# Altium schematic symbol library My Library.SchLib: 1211 symbols (part 9 of 12) (continued)
## Motor Step
designator B?
Motor Stepper; Published: 24-Mar-1999; LatestRevisionDate: 17-Jul-2002; LatestRevisionNote: Re-released for DXP Platform.; PackageReference: DIP-6; Publisher: Altium Limited; Code_JEDEC: MO-001-AM
footprint HDR1X6 - L (Connector; Header; 6 Position)
footprint HDR1X6 - L (Connector; Header; 6 Position)
pins: 1 1A, 2, 3, 4, 5, 6
text: M

## MPS20N0040D-D
designator IC?
Pressure Sensor
footprint SOP-6
pins: 1 OUT- (out), 2 IN- (in), 3 NC, 4 OUT+ (out), 5 IN+ (in), 6 OUT- (out)

## MPU6050
designator MU?
Manufacturer: W¨¹rth Elektronik eiSos GmbH; partNo: 613004143121; ComponentLink1 Description: Manufacturer; ComponentLink2 Description: Datasheet; NoPins: 04; Created Date: 29 March 2013; ComponentLink1URL: http://www.we-online.com; ComponentLink2URL: http://katalog.we-online.de/em/datasheet/6130xx143121.pdf; Created by: Karrer Zheng
footprint MPU6050
pins: 1 VCC, 2 GND, 3 SCL, 4 SDA, 5 XDA, 6 XCL, 7 AD0, 8 INT

## MPX5050GP
designator S?
50kPa Air Pressure Sensor
footprint HDR1X6 (Connector; Header; 6 Position)
pins: 1 VOUT, 2 GND, 3 VCC, 4 NC, 5 NC, 6 NC

## MQ2
designator J?, comment Gas Sensor Socket
footprint MQ2 (6P-D17.6X9.8H)
pins: 1 A, 2 H, 3 A, 4 B, 5 H, 6 B

## MQ2-MOD
designator C?
Manufacturer: W¨¹rth Elektronik eiSos GmbH; partNo: 613004143121; ComponentLink1 Description: Manufacturer; ComponentLink2 Description: Datasheet; NoPins: 04; Created Date: 29 March 2013; ComponentLink1URL: http://www.we-online.com; ComponentLink2URL: http://katalog.we-online.de/em/datasheet/6130xx143121.pdf; Created by: Karrer Zheng
footprint MQ2-MODULE
footprint JP4-C1T (4 row, straight, gold plating)
pins: 1 Aout, 2 Dout, 3 GND, 4 VCC
text: MQ2

## MQ5-MOD
designator C?
Manufacturer: W¨¹rth Elektronik eiSos GmbH; partNo: 613004143121; ComponentLink1 Description: Manufacturer; ComponentLink2 Description: Datasheet; NoPins: 04; Created Date: 29 March 2013; ComponentLink1URL: http://www.we-online.com; ComponentLink2URL: http://katalog.we-online.de/em/datasheet/6130xx143121.pdf; Created by: Karrer Zheng
footprint MQ5-MODULE
footprint JP4-C1T (4 row, straight, gold plating)
pins: 1 Dout, 2 Aout, 3 GND, 4 VCC
text: MQ5

## MQ6-MOD
designator C?
Manufacturer: W¨¹rth Elektronik eiSos GmbH; partNo: 613004143121; ComponentLink1 Description: Manufacturer; ComponentLink2 Description: Datasheet; NoPins: 04; Created Date: 29 March 2013; ComponentLink1URL: http://www.we-online.com; ComponentLink2URL: http://katalog.we-online.de/em/datasheet/6130xx143121.pdf; Created by: Karrer Zheng
footprint MQ6-MODULE
footprint JP4-C1T (4 row, straight, gold plating)
pins: 1 Aout, 2 Dout, 3 GND, 4 VCC
text: MQ6

## MQ7-MOD
designator C?
Manufacturer: W¨¹rth Elektronik eiSos GmbH; partNo: 613004143121; ComponentLink1 Description: Manufacturer; ComponentLink2 Description: Datasheet; NoPins: 04; Created Date: 29 March 2013; ComponentLink1URL: http://www.we-online.com; ComponentLink2URL: http://katalog.we-online.de/em/datasheet/6130xx143121.pdf; Created by: Karrer Zheng
footprint MQ6-MODULE
footprint JP4-C1T (4 row, straight, gold plating)
pins: 1 Dout, 2 Aout, 3 GND, 4 VCC
text: MQ7

## MQ-2
designator IC?
MQ-2 GAS SENSOR
footprint MQ-2 (MQ-2 GAS SENSOR)
pins: 1 A, 2 H, 3 A, 4 B, 5 H, 6 B

## MRF24J40MA
designator M?
Microchip Zigbee Module
footprint MRF24J40MA (Microchip Zigbee Module)
pins: 1 GND, 2 ~{RESET}, 3 WAKE, 4 INT, 5 SDI, 6 SDK, 7 SDO, 8 ~{CS}, 9 CLKOUT, 10 VIN, 11 GND, 12 GND

## MRF24J40MA_1
designator M?, comment MRF24J40MA
Microchip Zigbee Module
footprint MRF24J40MA (Microchip Zigbee Module)
pins: 1 GND, 2 ~{RESET}, 3 WAKE, 4 INT, 5 SDI, 6 SDK, 7 SDO, 8 ~{CS}, 9 CLKOUT, 10 VIN, 11 GND, 12 GND

## MSP430_launchpad
designator KIT?
footprint MSP430_launchpad
pins: 1 3V3, 2 P1.0, 3 P1.1/RXD, 4 P1.2/TXD, 5 1.3, 6 1.4, 7 1.5, 8 2.0, 9 2.1, 10 2.2, 11 2.3, 12 2.4, 13 2.5, 14 1.6, 15 1.7, 16 RST, 17 TEST, 18 2.6, 19 2.7, 20 GND

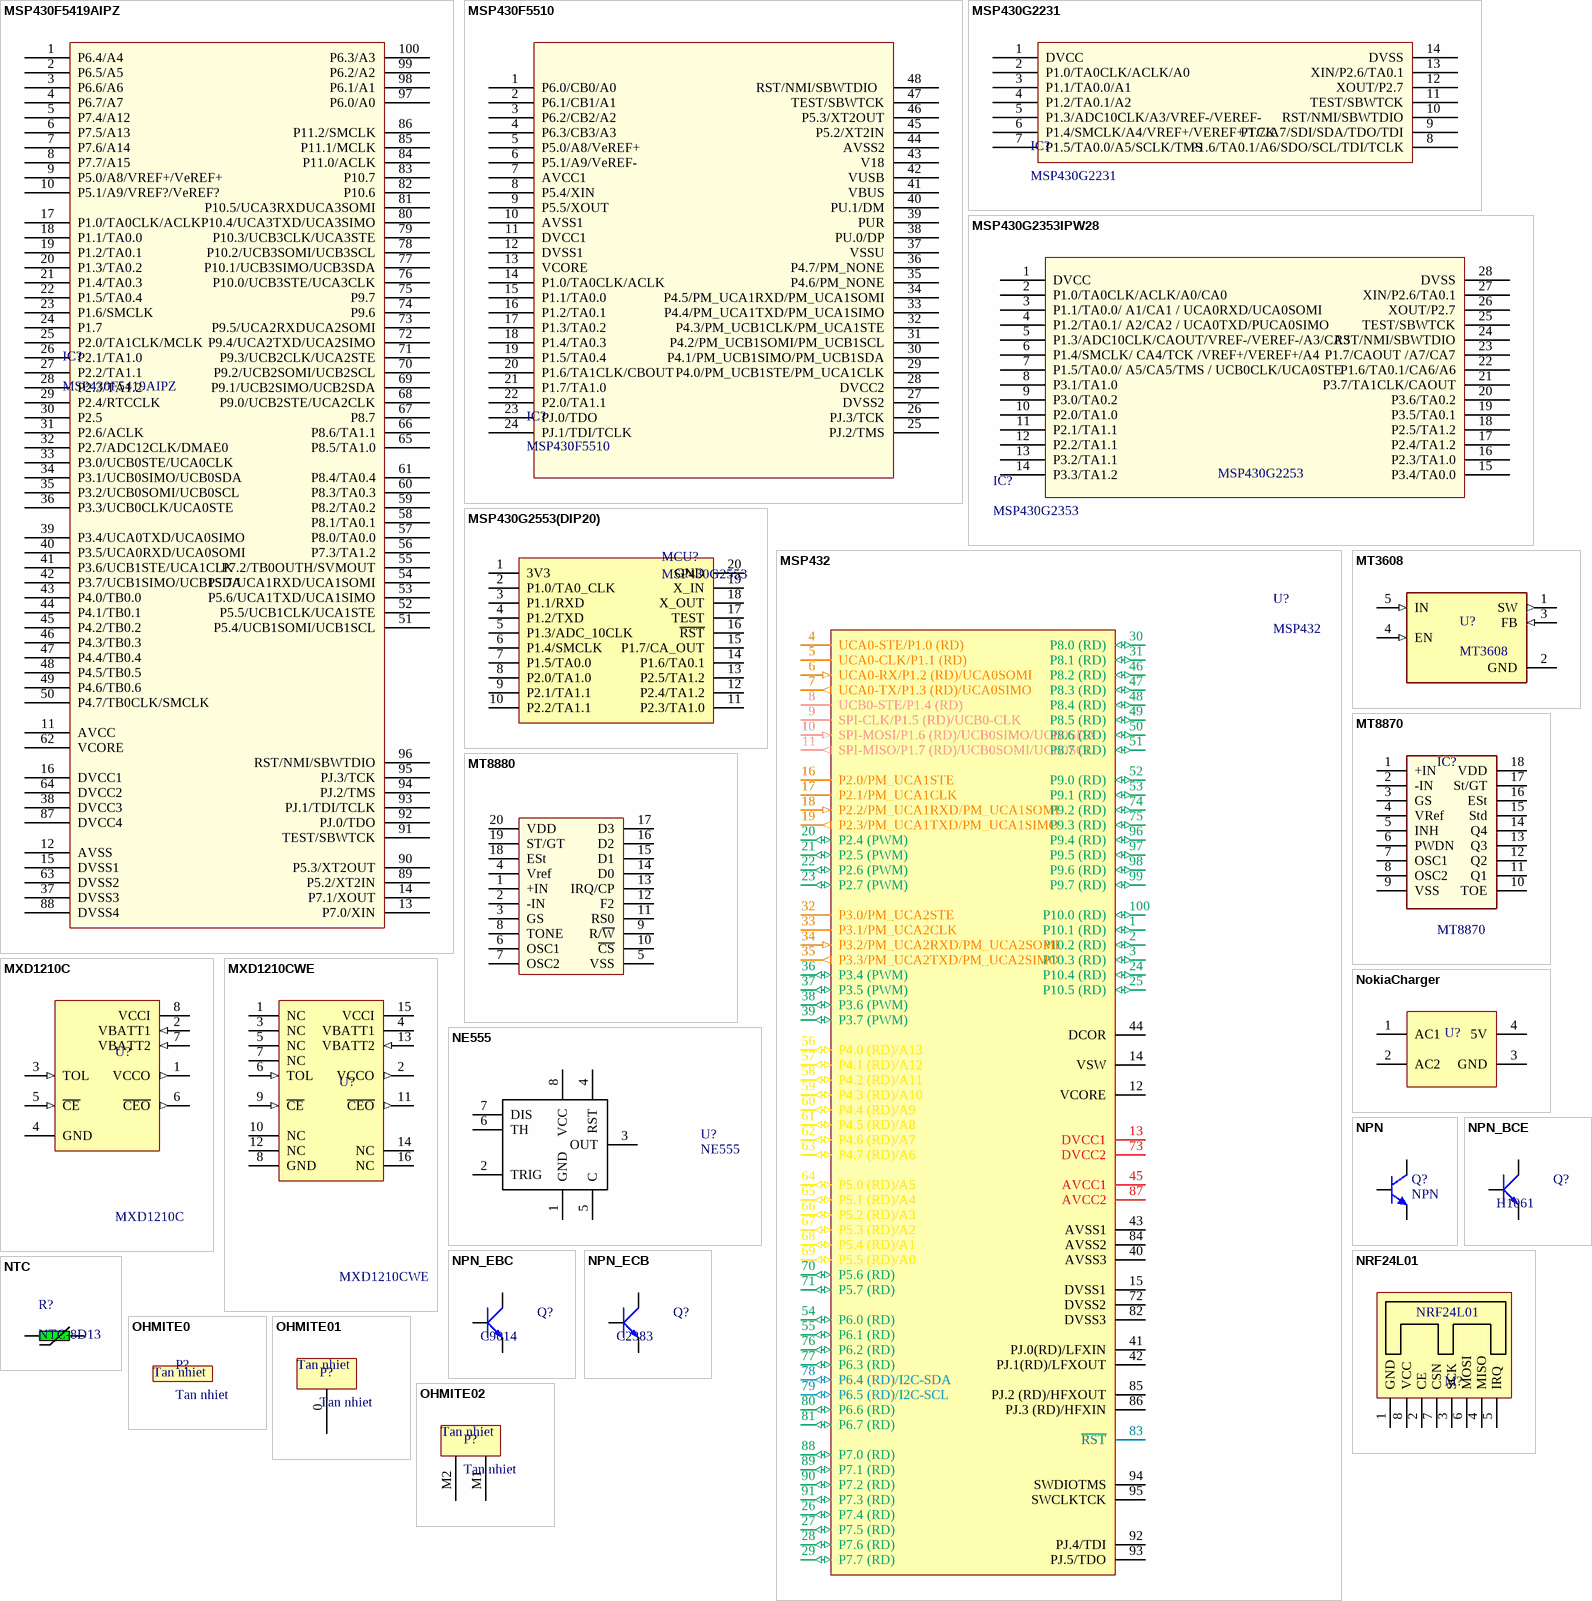
[diagram p55: symbols MSP430F5419AIPZ to OHMITE02]

## MSP430F5419AIPZ
designator IC?
pins: 1 P6.4/A4, 2 P6.5/A5, 3 P6.6/A6, 4 P6.7/A7, 5 P7.4/A12, 6 P7.5/A13, 7 P7.6/A14, 8 P7.7/A15, 9 P5.0/A8/VREF+/VeREF+, 10 P5.1/A9/VREF?/VeREF?, 11 AVCC, 12 AVSS, 13 P7.0/XIN, 14 P7.1/XOUT, 15 DVSS1, 16 DVCC1, 17 P1.0/TA0CLK/ACLK, 18 P1.1/TA0.0, 19 P1.2/TA0.1, 20 P1.3/TA0.2, 21 P1.4/TA0.3, 22 P1.5/TA0.4, 23 P1.6/SMCLK, 24 P1.7, 25 P2.0/TA1CLK/MCLK, 26 P2.1/TA1.0, 27 P2.2/TA1.1, 28 P2.3/TA1.2, 29 P2.4/RTCCLK, 30 P2.5, 31 P2.6/ACLK, 32 P2.7/ADC12CLK/DMAE0, 33 P3.0/UCB0STE/UCA0CLK, 34 P3.1/UCB0SIMO/UCB0SDA, 35 P3.2/UCB0SOMI/UCB0SCL, 36 P3.3/UCB0CLK/UCA0STE, 37 DVSS3, 38 DVCC3, 39 P3.4/UCA0TXD/UCA0SIMO, 40 P3.5/UCA0RXD/UCA0SOMI, 41 P3.6/UCB1STE/UCA1CLK, 42 P3.7/UCB1SIMO/UCB1SDA, 43 P4.0/TB0.0, 44 P4.1/TB0.1, 45 P4.2/TB0.2, 46 P4.3/TB0.3, 47 P4.4/TB0.4, 48 P4.5/TB0.5, 49 P4.6/TB0.6, 50 P4.7/TB0CLK/SMCLK, 51 P5.4/UCB1SOMI/UCB1SCL, 52 P5.5/UCB1CLK/UCA1STE, 53 P5.6/UCA1TXD/UCA1SIMO, 54 P5.7/UCA1RXD/UCA1SOMI, 55 P7.2/TB0OUTH/SVMOUT, 56 P7.3/TA1.2, 57 P8.0/TA0.0, 58 P8.1/TA0.1, 59 P8.2/TA0.2, 60 P8.3/TA0.3, 61 P8.4/TA0.4, 62 VCORE, 63 DVSS2, 64 DVCC2, 65 P8.5/TA1.0, 66 P8.6/TA1.1, 67 P8.7, 68 P9.0/UCB2STE/UCA2CLK, 69 P9.1/UCB2SIMO/UCB2SDA, 70 P9.2/UCB2SOMI/UCB2SCL, 71 P9.3/UCB2CLK/UCA2STE, 72 P9.4/UCA2TXD/UCA2SIMO, 73 P9.5/UCA2RXDUCA2SOMI, 74 P9.6, 75 P9.7, 76 P10.0/UCB3STE/UCA3CLK, 77 P10.1/UCB3SIMO/UCB3SDA, 78 P10.2/UCB3SOMI/UCB3SCL, 79 P10.3/UCB3CLK/UCA3STE, 80 P10.4/UCA3TXD/UCA3SIMO, 81 P10.5/UCA3RXDUCA3SOMI, 82 P10.6, 83 P10.7, 84 P11.0/ACLK, 85 P11.1/MCLK, 86 P11.2/SMCLK, 87 DVCC4, 88 DVSS4, 89 P5.2/XT2IN, 90 P5.3/XT2OUT, 91 TEST/SBWTCK, 92 PJ.0/TDO, 93 PJ.1/TDI/TCLK, 94 PJ.2/TMS, 95 PJ.3/TCK, 96 RST/NMI/SBWTDIO, 97 P6.0/A0, 98 P6.1/A1, 99 P6.2/A2, 100 P6.3/A3

## MSP430F5510
designator IC?
pins: 1 P6.0/CB0/A0, 2 P6.1/CB1/A1, 3 P6.2/CB2/A2, 4 P6.3/CB3/A3, 5 P5.0/A8/VeREF+, 6 P5.1/A9/VeREF-, 7 AVCC1, 8 P5.4/XIN, 9 P5.5/XOUT, 10 AVSS1, 11 DVCC1, 12 DVSS1, 13 VCORE, 14 P1.0/TA0CLK/ACLK, 15 P1.1/TA0.0, 16 P1.2/TA0.1, 17 P1.3/TA0.2, 18 P1.4/TA0.3, 19 P1.5/TA0.4, 20 P1.6/TA1CLK/CBOUT, 21 P1.7/TA1.0, 22 P2.0/TA1.1, 23 PJ.0/TDO, 24 PJ.1/TDI/TCLK, 25 PJ.2/TMS, 26 PJ.3/TCK, 27 DVSS2, 28 DVCC2, 29 P4.0/PM_UCB1STE/PM_UCA1CLK, 30 P4.1/PM_UCB1SIMO/PM_UCB1SDA, 31 P4.2/PM_UCB1SOMI/PM_UCB1SCL, 32 P4.3/PM_UCB1CLK/PM_UCA1STE, 33 P4.4/PM_UCA1TXD/PM_UCA1SIMO, 34 P4.5/PM_UCA1RXD/PM_UCA1SOMI, 35 P4.6/PM_NONE, 36 P4.7/PM_NONE, 37 VSSU, 38 PU.0/DP, 39 PUR, 40 PU.1/DM, 41 VBUS, 42 VUSB, 43 V18, 44 AVSS2, 45 P5.2/XT2IN, 46 P5.3/XT2OUT, 47 TEST/SBWTCK, 48 RST/NMI/SBWTDIO  

## MSP430G2231
designator IC?
footprint TSOP-14 (TSOP, 14-Leads, Body 5,1x4,5mm (max), Pitch 0,65mm, IPC Medium Density)
pins: 1 DVCC, 2 P1.0/TA0CLK/ACLK/A0, 3 P1.1/TA0.0/A1, 4 P1.2/TA0.1/A2, 5 P1.3/ADC10CLK/A3/VREF-/VEREF-, 6 P1.4/SMCLK/A4/VREF+/VEREF+/TCK, 7 P1.5/TA0.0/A5/SCLK/TMS, 8 P1.6/TA0.1/A6/SDO/SCL/TDI/TCLK, 9 P1.7/A7/SDI/SDA/TDO/TDI, 10 RST/NMI/SBWTDIO, 11 TEST/SBWTCK, 12 XOUT/P2.7, 13 XIN/P2.6/TA0.1, 14 DVSS

## MSP430G2353IPW28
designator IC?, comment MSP430G2353
MIXED SIGNAL MICROCONTROLLER
footprint TSOP65P640X120-28N (TSOP, 28-Leads, Body 9,8x4,5mm (max), Pitch 0,65mm, IPC Medium Density)
pins: 1 DVCC, 2 P1.0/TA0CLK/ACLK/A0/CA0, 3 P1.1/TA0.0/ A1/CA1 / UCA0RXD/UCA0SOMI, 4 P1.2/TA0.1/ A2/CA2 / UCA0TXD/PUCA0SIMO, 5 P1.3/ADC10CLK/CAOUT/VREF-/VEREF-/A3/CA3, 6 P1.4/SMCLK/ CA4/TCK /VREF+/VEREF+/A4, 7 P1.5/TA0.0/ A5/CA5/TMS / UCB0CLK/UCA0STE, 8 P3.1/TA1.0, 9 P3.0/TA0.2, 10 P2.0/TA1.0, 11 P2.1/TA1.1, 12 P2.2/TA1.1, 13 P3.2/TA1.1, 14 P3.3/TA1.2, 15 P3.4/TA0.0, 16 P2.3/TA1.0, 17 P2.4/TA1.2, 18 P2.5/TA1.2, 19 P3.5/TA0.1, 20 P3.6/TA0.2, 21 P3.7/TA1CLK/CAOUT, 22 P1.6/TA0.1/CA6/A6, 23 P1.7/CAOUT /A7/CA7, 24 RST/NMI/SBWTDIO, 25 TEST/SBWTCK, 26 XOUT/P2.7, 27 XIN/P2.6/TA0.1, 28 DVSS
text: MSP430G2253

## MSP430G2553(DIP20)
designator MCU?, comment MSP430G2553
footprint DIP20/W0.3 (DIP 20, 20 PIN, W 300mil, Pin to pin 100mil)
pins: 1 3V3, 2 P1.0/TA0_CLK, 3 P1.1/RXD, 4 P1.2/TXD, 5 P1.3/ADC_10CLK, 6 P1.4/SMCLK, 7 P1.5/TA0.0, 8 P2.0/TA1.0, 9 P2.1/TA1.1, 10 P2.2/TA1.1, 11 P2.3/TA1.0, 12 P2.4/TA1.2, 13 P2.5/TA1.2, 14 P1.6/TA0.1, 15 P1.7/CA_OUT, 16 ~{RST}, 17 TEST, 18 X_OUT, 19 X_IN, 20 GND

## MSP432
designator U?
footprint Quad100
pins: 1 P10.1 (RD) (io), 2 P10.2 (RD) (io), 3 P10.3 (RD) (io), 4 UCA0-STE/P1.0 (RD), 5 UCA0-CLK/P1.1 (RD), 6 UCA0-RX/P1.2 (RD)/UCA0SOMI (in), 7 UCA0-TX/P1.3 (RD)/UCA0SIMO (out), 8 UCB0-STE/P1.4 (RD), 9 SPI-CLK/P1.5 (RD)/UCB0-CLK, 10 SPI-MOSI/P1.6 (RD)/UCB0SIMO/UCB0SDA (in), 11 SPI-MISO/P1.7 (RD)/UCB0SOMI/UCB0SCL  (out), 12 VCORE (power), 13 DVCC1 (power), 14 VSW (power), 15 DVSS1 (power), 16 P2.0/PM_UCA1STE, 17 P2.1/PM_UCA1CLK, 18 P2.2/PM_UCA1RXD/PM_UCA1SOMI  (in), 19 P2.3/PM_UCA1TXD/PM_UCA1SIMO (out), 20 P2.4 (PWM) (io), 21 P2.5 (PWM) (io), 22 P2.6 (PWM) (io), 23 P2.7 (PWM) (io), 24 P10.4 (RD) (io), 25 P10.5 (RD) (io), 26 P7.4 (RD) (io), 27 P7.5 (RD) (io), 28 P7.6 (RD) (io), 29 P7.7 (RD) (io), 30 P8.0 (RD) (io), 31 P8.1 (RD) (io), 32 P3.0/PM_UCA2STE, 33 P3.1/PM_UCA2CLK, 34 P3.2/PM_UCA2RXD/PM_UCA2SOMI (in), 35 P3.3/PM_UCA2TXD/PM_UCA2SIMO (out), 36 P3.4 (PWM) (io), 37 P3.5 (PWM) (io), 38 P3.6 (PWM) (io), 39 P3.7 (PWM) (io), 40 AVSS3 (power), 41 PJ.0(RD)/LFXIN (power), 42 PJ.1(RD)/LFXOUT (power), 43 AVSS1 (power), 44 DCOR (power), 45 AVCC1 (power), 46 P8.2 (RD) (io), 47 P8.3 (RD) (io), 48 P8.4 (RD) (io), 49 P8.5 (RD) (io), 50 P8.6 (RD) (io), 51 P8.7 (RD) (io), 52 P9.0 (RD) (io), 53 P9.1 (RD) (io), 54 P6.0 (RD) (io), 55 P6.1 (RD) (io), 56 P4.0 (RD)/A13 (io), 57 P4.1 (RD)/A12 (io), 58 P4.2 (RD)/A11 (io), 59 P4.3 (RD)/A10 (io), 60 P4.4 (RD)/A9 (io), 61 P4.5 (RD)/A8 (io), 62 P4.6 (RD)/A7 (io), 63 P4.7 (RD)/A6 (io), 64 P5.0 (RD)/A5 (io), 65 P5.1 (RD)/A4 (io), 66 P5.2 (RD)/A3 (io), 67 P5.3 (RD)/A2 (io), 68 P5.4 (RD)/A1 (io), 69 P5.5 (RD)/A0 (io), 70 P5.6 (RD) (io), 71 P5.7 (RD) (io), 72 DVSS2 (power), 73 DVCC2 (power), 74 P9.2 (RD) (io), 75 P9.3 (RD) (io), 76 P6.2 (RD) (io), 77 P6.3 (RD) (io), 78 P6.4 (RD)/I2C-SDA (io), 79 P6.5 (RD)/I2C-SCL (io), 80 P6.6 (RD) (io), 81 P6.7 (RD) (io), 82 DVSS3 (power), 83 ~{RST} (power), 84 AVSS2 (power), 85 PJ.2 (RD)/HFXOUT, 86 PJ.3 (RD)/HFXIN, 87 AVCC2 (power), 88 P7.0 (RD) (io), 89 P7.1 (RD) (io), 90 P7.2 (RD) (io), 91 P7.3 (RD) (io), 92 PJ.4/TDI, 93 PJ.5/TDO, 94 SWDIOTMS (power), 95 SWCLKTCK (power), 96 P9.4 (RD) (io), 97 P9.5 (RD) (io), 98 P9.6 (RD) (io), 99 P9.7 (RD) (io), 100 P10.0 (RD) (io)

## MT3608
designator U?
High Efficiency 1.2MHz 2A Step Up Converter
pins: 1 SW (out), 2 GND (power), 3 FB (in), 4 EN (in), 5 IN (in)

## MT8870
designator IC?
DTMF RECEIVER IC MT8870 TESTER; Value: MT8068
footprint DIP18/W0.3 (18 PIN, W 300mil, Pin to pin 100mil)
pins: 1 +IN, 2 -IN, 3 GS, 4 VRef, 5 INH, 6 PWDN, 7 OSC1, 8 OSC2, 9 VSS, 10 TOE, 11 Q1, 12 Q2, 13 Q3, 14 Q4, 15 Std, 16 ESt, 17 St/GT, 18 VDD

## MT8880
designator IC?, comment MT8880C
Integrated DTMF Transceiver; Value: DIP20; Value: MT8880C
footprint DIP20/W0.3 (DIP 20, 20 PIN, W 300mil, Pin to pin 100mil)
pins: 1 +IN, 2 -IN, 3 GS, 4 Vref, 5 VSS, 6 OSC1, 7 OSC2, 8 TONE, 9 R/~{W}, 10 ~{CS}, 11 RS0, 12 F2, 13 IRQ/CP, 14 D0, 15 D1, 16 D2, 17 D3, 18 ESt, 19 ST/GT, 20 VDD

## MXD1210C
designator U?
Nonvolatile RAM Controller; Published: 16-Jan-2001; LatestRevisionDate: 29-May-2009; LatestRevisionNote: Component Body Added.; DatasheetVersion: Mar-1996; PackageVersion: RevB, 21-0043; PackageReference: PA8; Publisher: Altium Limited; PackageDescription: DIP, 8-Pin, Row Spacing 7.62 mm, Pitch 2.54 mm; Code_JEDEC: MS-001-AB; ComponentLink1Description: Manufacturer Link; ComponentLink1URL: http://www.maxim-ic.com/; ComponentLink2Description: Datasheet; ComponentLink2URL: http://pdfserv.maxim-ic.com/en/ds/MXD1210.pdf
footprint DIP8
footprint SO8 (SOIC, 8-Leads, Body 4.9x3.9mm, Pitch 1.27mm, IPC High Density)
pins: 1 VCCO (out), 2 VBATT1 (in), 3 TOL (in), 4 GND (power), 5 ~{CE} (in), 6 ~{CEO} (out), 7 VBATT2 (in), 8 VCCI (power)

## MXD1210CWE
designator U?
Nonvolatile RAM Controller; Published: 16-Jan-2001; LatestRevisionDate: 13-Apr-2006; LatestRevisionNote: IPC-7351 Footprint Added.; DatasheetVersion: Mar-1996; PackageReference: WSO16; Publisher: Altium Limited; PackageDescription: 16-Pin Small Outline Integrated Circuit 1.27 mm Pitch; Code_JEDEC: MS-013-AA; Code_IPC: SOIC127P1030-16; ComponentLink1Description: Manufacturer Link; ComponentLink1URL: http://www.maxim-ic.com/; ComponentLink2Description: Datasheet; ComponentLink2URL: http://pdfserv.maxim-ic.com/en/ds/MXD1210.pdf
footprint SO16L (SOIC, 16-Leads, Body 10.30x7.50mm, Pitch 1.27mm, IPC Medium Density)
pins: 1 NC, 2 VCCO (out), 3 NC, 4 VBATT1 (power), 5 NC, 6 TOL (in), 7 NC, 8 GND (power), 9 ~{CE} (in), 10 NC, 11 ~{CEO} (out), 12 NC, 13 VBATT2 (in), 14 NC, 15 VCCI (power), 16 NC

## NE555
designator U?
TIMER IC; Manufacturer Part Number: NE555DT; Manufacturer: STMicroelectronics; Frequency: 500kHz; Voltage - Supply: 4.5 V ~ 16 V; Current: 200mA; Supplier 1: Digi-Key; Supplier Part Number 1: 497-1962-2-ND; Supplier: Digi-Key; Category: Integrated Circuits (ICs); Supplier Part Number: 497-1962-2-ND; Package / Case: 8-SOIC (3.9mm Width); Packaging: Tape & Reel (TR); RoHS: RoHS Compliant; Operating Temperature: 0°C ~ 70°C; Count: -; Type: 555 Type, Timer/Oscillator (Single)
footprint SO8
footprint DIP8
pins: 1 GND, 2 TRIG, 3 OUT, 4 RST, 5 C, 6 TH, 7 DIS, 8 VCC

## NokiaCharger
designator U?, comment 6V Nokia Charger  (value not drawn)
Creator: Bien Nguyen
footprint NokiaCharger
pins: 1 AC1, 2 AC2, 3 GND, 4 5V

## NPN
designator Q?
NPN General; Published: 8-Jun-2000; LatestRevisionDate: 15-Jan-2003; LatestRevisionNote: PCB Footprint 'BCY-W3/D4.7' replaced; DatasheetDocument: 1997; PackageDocument: Sep-1998; PackageReference: TO-92A; Publisher: Altium Limited; Code_JEDEC: TO-92A; ComponentLink1Description: Manufacturer Link; ComponentLink1URL: http://www.fairchildsemi.com/; ComponentLink2Description: Datasheet; ComponentLink2URL: http://www.fairchildsemi.com/ds/2N%2F2N3904.pdf
footprint TRAN-LOWPOWER (TO, Flat Index; 3 In-Line, Axial Leads; Body Dia. 4.5mm; Leads 0.51 x 0.48 mm (max))
pins: 1 E, 2 C, 3 B

## NPN_BCE
designator Q?, comment H1061
P 1W, BCE; Value: TIP41
footprint QTO-220 (TO-220 - 1-2-3)
pins: 1 B, 2 C, 3 E

## NPN_EBC
designator Q?, comment C9014
P 600mW, EBC; Value: C9014
footprint QTO-92 (TO-92)
pins: 1 E, 2 B, 3 C

## NPN_ECB
designator Q?, comment C2383
P 600mW, ECB; Value: C1815
footprint QTO-92 (TO-92)
pins: 1 E, 2 C, 3 B

## NRF24L01
designator M?
footprint NRF24L01
footprint JP4-C2T (8 pins, dual row, straight, gold plating)
pins: 1 GND, 2 CE, 3 SCK, 4 MISO, 5 IRQ, 6 MOSI, 7 CSN, 8 VCC

## NTC
designator R?, comment NTC-8D13
NTC THERMISTORS; Value: NTC
footprint NTC D13
pins: 1, 2

## OHMITE0
designator P?, comment Tan nhiet
footprint OHMITE0_1 (HALF BRICK CONVERTER HEATSINK)
footprint OHMITE0_2 (HALF BRICK CONVERTER HEATSINK)
footprint OHMITE0_3 (HALF BRICK CONVERTER HEATSINK)
footprint OHMITE0_4 (HALF BRICK CONVERTER HEATSINK)
footprint OHMITE0_5 (HALF BRICK CONVERTER HEATSINK)

## OHMITE01
designator P?, comment Tan nhiet
footprint OHMITE1_1
footprint OHMITE1_2
footprint OHMITE1_3
pins: 0

## OHMITE02
designator P?, comment Tan nhiet
footprint OHMITE2_2
footprint OHMITE2_1
pins: M1, M2

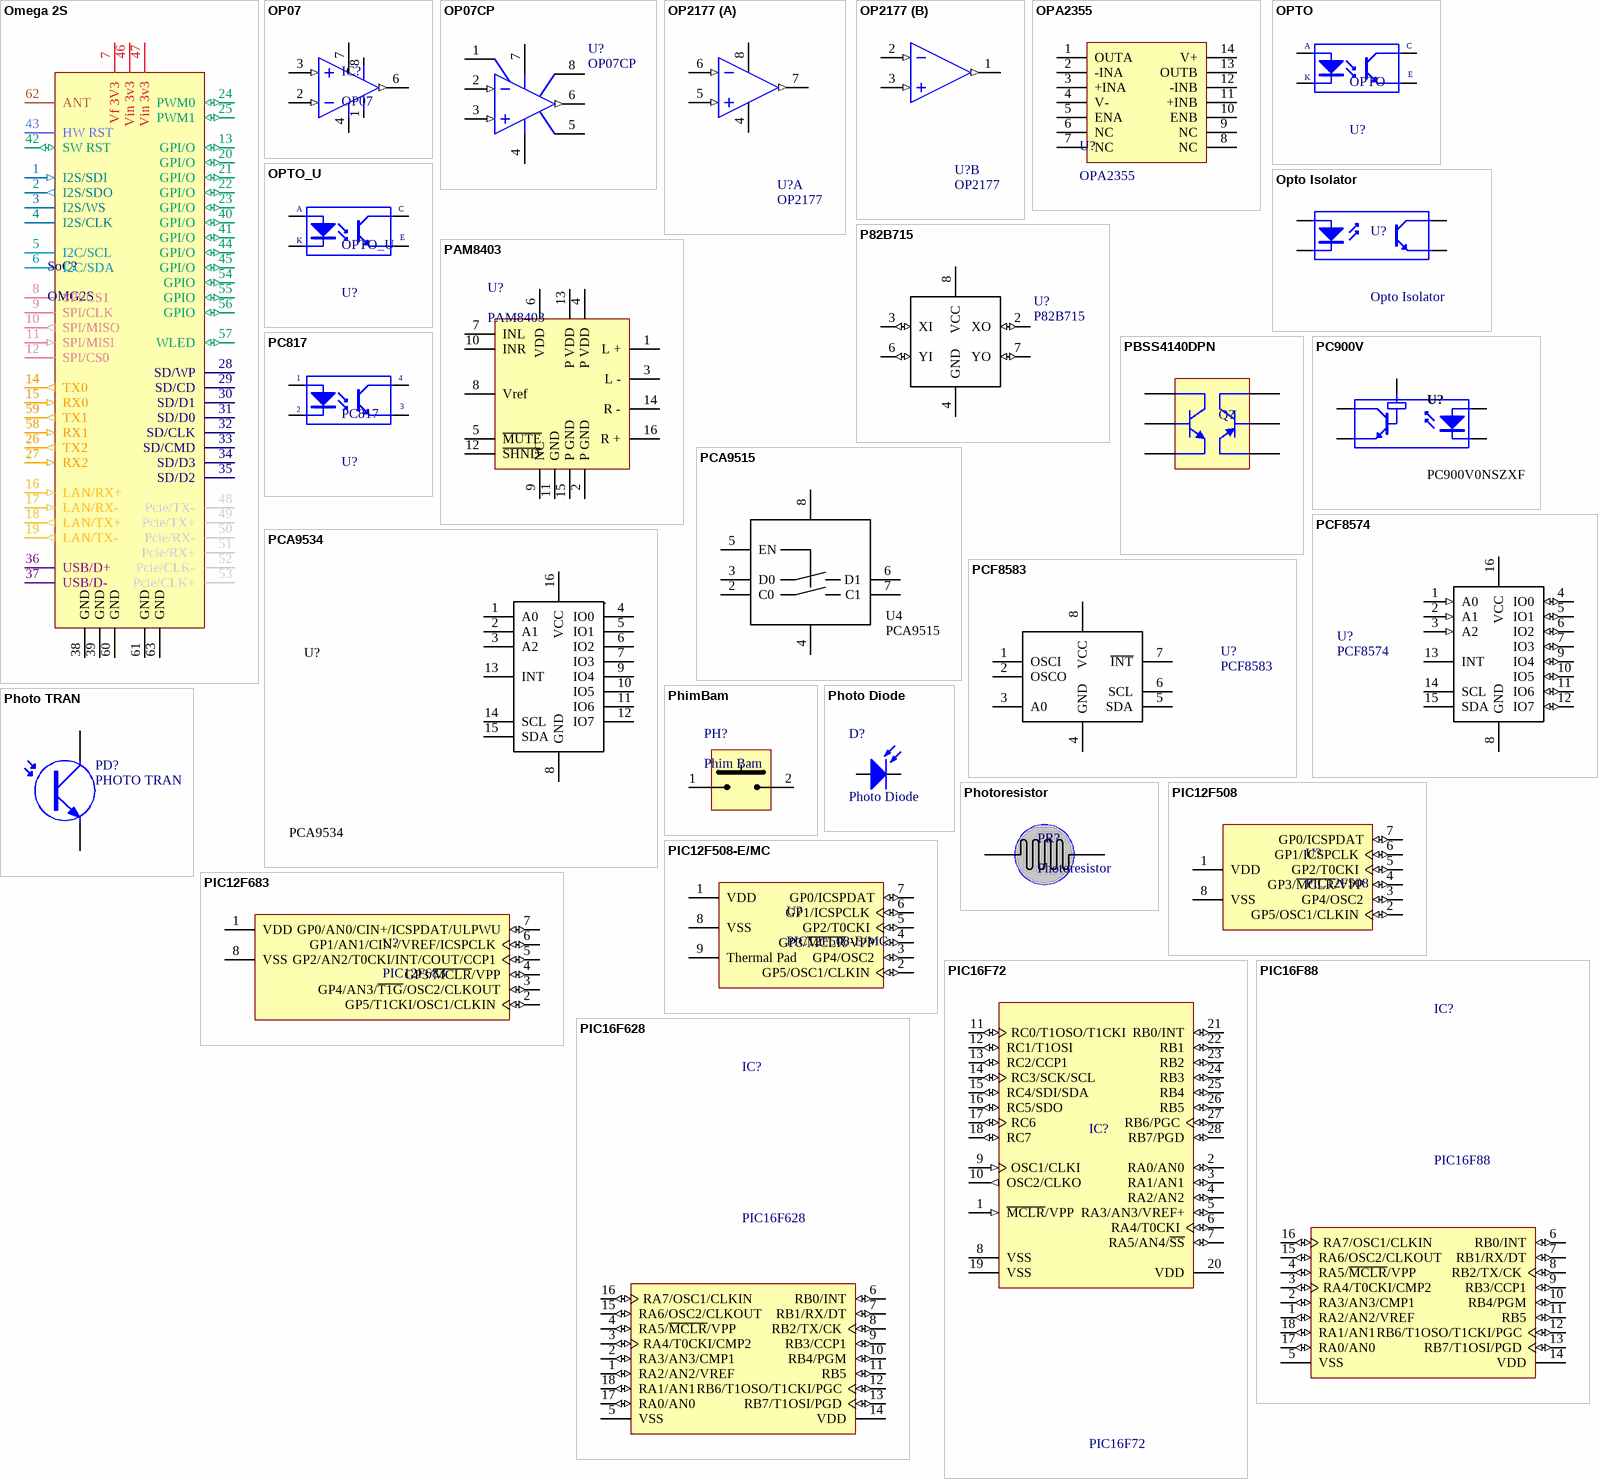
[diagram p56: symbols Omega 2S to PIC16F628]
